# Altium schematic symbol library CUSTOM SCH - Copy.SchLib: 494 symbols (part 5 of 6) (continued)
## UF4007
designator D?
Led Zpower Warm White 3000K 2SMD; Manufacturer 1: Seoul Semiconductor; Manufacturer Part Number: N42180-06-S2; Max Current Rating: 800mA; Luminous Flux: 65lm; Test Current: 350mA; Thermal Resistance of Package: 8.5°C/W; Forward Voltage: 3.1V; Viewing Angle: 126°; Supplier 1: Digi-Key; RoHS: Yes; Category: LEDs; Stock 1: 29310; Pricing 1: 1=2.54000, 10=2.28800, 100=2.14400 (USD); Mount: Surface Mount; Case/Package: SMD/SMT; Color: White; Correlated Color Temperature (CCT): 3000K; Package Quantity: 500; Packaging: Tape and Reel; ComponentLink1URL: https://datasheet.ciiva.com/29560/x42180-070-29560315.pdf?src-supplier=Digi-Key; ComponentLink1Description: https://datasheet.ciiva.com/29560/x42180-070-29560315.pdf?src-supplier=Digi-Key; ComponentLink2URL: https://datasheet.ciiva.com/29560/x42180-070-29560316.pdf?src-supplier=Digi-Key; ComponentLink2Description: https://datasheet.ciiva.com/29560/x42180-070-29560316.pdf?src-supplier=Digi-Key; Supplier Part Number 1: N42180-06-S2CT-ND
footprint 1W POWER LED
pins: 1 K, 2 A, 3 TH

## UJ2-MIBH-3-MSMT-TR-67
designator J?
Waterproof USB Connectors USB jack 2.0; Manufacturer Part Number: UJ2-MIBH-3-MSMT-TR-67; CAse/Package: 490-UJ2MIBH3MSMTTR67; Mouser Price/Stock: https://www.mouser.co.uk/ProductDetail/CUI-Devices/UJ2-MIBH-3-MSMT-TR-67?qs=l7cgNqFNU1iQf9Yue11bmg%3D%3D; Arrow Part Number: UJ2-MIBH-3-MSMT-TR-67; Arrow Price/Stock: https://www.arrow.com/en/products/uj2-mibh-3-msmt-tr-67/cui-devices
footprint UJ2MIBH3MSMTTR67
pins: 1, 2, 3, 4, 5, MH1, MH2, MH3, MH4

## USB3300-EZK
designator U?  Supplier Part Number 1: USB3300-EZK-CT-ND
Hi-Speed USB Host, Device or OTG PHY with / ULPI Low Pin Interface; Manufacturer: Microchip; Manufacturer Part Number: USB3300-EZK-TR; Operating Supply Voltage: 3.3V; Data Rate: 480Mbps; Supplier 1: Digi-Key; RoHS: Yes; Category: USB Interface ICs; Stock 1: 4754; Pricing 1: 1=1.24000, 25=1.04000, 100=0.95760 (USD); Mount: Surface Mount; Case/Package: QFN; Number of Pins: 32; Weight: 0.006653oz; Contact Plating: Tin,Matte; Min Operating Temperature: -40°C; Max Operating Temperature: 85°C; Packaging: Tape and Reel; Package Quantity: 4000; Radiation Hardening: No; Lead Free: Lead Free; ComponentLink1URL: https://datasheet.ciiva.com/6635/filehandler-aspxddocname-en562663-6635175.pdf?src-supplier=Digi-Key; ComponentLink1Description: https://datasheet.ciiva.com/6635/filehandler-aspxddocname-en562663-6635175.pdf?src-supplier=Digi-Key
footprint 32-QFN (5x5)
pins: 1 GND (power), 2 GND (power), 3 CPEN (out), 4 VBUS (io), 5 ID (in), 6 VDD3.3 (power), 7 DP (io), 8 DM (io), 9 RESET (in), 10 EXTVBUS (in), 11 NXT (out), 12 DIR (out), 13 STP (in), 14 CLKOUT (out), 15 VDD1.8 (power), 16 VDD3.3 (power), 17 DATA7 (io), 18 DATA6 (io), 19 DATA5 (io), 20 DATA4 (io), 21 DATA3 (io), 22 DATA2 (io), 23 DATA1 (io), 24 DATA0 (io), 25 VDD3.3 (power), 26 VDD1.8 (power), 27 XO, 28 XI, 29 VDDA1.8 (power), 30 VDD3.3 (power), 31 REG_EN, 32 RBIAS, 33 EPAD
text: USB3300

## USB 4pins_0
designator J?
pins: 1, 2, 3, 4, 5, 6
text: V; D-; D+; G

## USB A Female
designator J?
USB-A (USB TYPE-A) USB 2.0 Receptacle Connector 4 Position Through Hole, Right Angle; Manufacturer: TE Connectivity; Manufacturer Part Number: 292303-1; Plating: Bright,Tin; Number of Positions: 4; Number of Ports: 1; Plating Thickness: 0.76um; Contact Current Rating: 1A; Circuit Application: Signal; Connector System: Cable-to-Board; USB Standard: USB 2.0; Insulation Resistance: 1GR; Voltage Rating (AC): 30V; Pitch: 2.5mm; PCB Thickness: 0.062inch; Tail Length: 0.112inch; Supplier 1: Digi-Key; Supplier Part Number 1: A31726-ND; RoHS: Yes; Category: Audio / Video Connectors; Stock 1: 16288; Pricing 1: 1=1.49000, 10=1.35400, 25=1.27160, 50=1.21620, 100=1.16100, 250=1.05040, 500=0.96748, 1000=0.82926, 2500=0.77398 (USD); Mount: Through Hole,Horizontal; Contact Plating: Gold; Housing Material: Thermoplastic; Housing Color: Black; Contact Material: Copper Alloy,Copper; Number of Terminals: 4; Color: Black; Min Operating Temperature: -67°C; Max Operating Temperature: 185°C; Termination: Through Hole; Package Quantity: 30; Orientation: Right Angle; Packaging: Rail/Tube; Gender: Receptacle; Connector Type: Receptacle; Number of Contacts: 4; Current Rating: 1A; Length: 14.63mm; Depth: 14mm; Flammability Rating: UL94 V-0; REACH SVHC: No SVHC; Halogen Free: Halogen Free; Case/Package: TH; ComponentLink1URL: https://datasheet.ciiva.com/851/eng-cd-292303-e9-851601.pdf?src-supplier=Farnell; ComponentLink1Description: https://datasheet.ciiva.com/851/eng-cd-292303-e9-851601.pdf?src-supplier=Farnell; ComponentLink2URL: https://datasheet.ciiva.com/1099/1653030-1099765.pdf?src-supplier=Newark; ComponentLink2Description: https://datasheet.ciiva.com/1099/1653030-1099765.pdf?src-supplier=Newark; ComponentLink3URL: https://datasheet.ciiva.com/1098/eng-cd-292303-e9-1098298.pdf?src-supplier=Element14; ComponentLink3Description: https://datasheet.ciiva.com/1098/eng-cd-292303-e9-1098298.pdf?src-supplier=Element14; ComponentLink4URL: https://datasheet.ciiva.com/11731/0900766b806d08c4-11731322.pdf?src-supplier=RSComponents; ComponentLink4Description: https://datasheet.ciiva.com/11731/0900766b806d08c4-11731322.pdf?src-supplier=RSComponents; ComponentLink5URL: https://datasheet.ciiva.com/14103/04270708-14103420.pdf?src-supplier=Distrelec; ComponentLink5Description: https://datasheet.ciiva.com/14103/04270708-14103420.pdf?src-supplier=Distrelec; ComponentLink6URL: https://datasheet.ciiva.com/19454/921651-19454494.pdf?src-supplier=Jameco; ComponentLink6Description: https://datasheet.ciiva.com/19454/921651-19454494.pdf?src-supplier=Jameco; ComponentLink7URL: https://datasheet.ciiva.com/16308/eng-cd-292303-e7-16308319.pdf?src-supplier=Future+Electronics; ComponentLink7Description: https://datasheet.ciiva.com/16308/eng-cd-292303-e7-16308319.pdf?src-supplier=Future+Electronics; ComponentLink8URL: https://datasheet.ciiva.com/3094/eng-ds-1-1773453-6-0908-3094357.pdf?src-supplier=Avnet; ComponentLink8Description: https://datasheet.ciiva.com/3094/eng-ds-1-1773453-6-0908-3094357.pdf?src-supplier=Avnet; ComponentLink9URL: https://datasheet.ciiva.com/16468/eng-ds-1-1773453-6-0908-16468232.pdf?src-supplier=Avnet+Asia; ComponentLink9Description: https://datasheet.ciiva.com/16468/eng-ds-1-1773453-6-0908-16468232.pdf?src-supplier=Avnet+Asia; ComponentLink10URL: https://datasheet.ciiva.com/851/eng-cd-292303-e9-851082.pdf?src-supplier=Digi-Key; ComponentLink10Description: https://datasheet.ciiva.com/851/eng-cd-292303-e9-851082.pdf?src-supplier=Digi-Key; ComponentLink11URL: https://datasheet.ciiva.com/8016/1653030-8016986.pdf?src-supplier=Element14; ComponentLink11Description: https://datasheet.ciiva.com/8016/1653030-8016986.pdf?src-supplier=Element14; ComponentLink12URL: https://datasheet.ciiva.com/14618/70041246-14618698.pdf?src-supplier=Allied+Electronics; ComponentLink12Description: https://datasheet.ciiva.com/14618/70041246-14618698.pdf?src-supplier=Allied+Electronics; ComponentLink13URL: https://datasheet.ciiva.com/25907/eng-ds-1-1773453-6-0908-25907515.pdf?src-supplier=Avnet+Europe; ComponentLink13Description: https://datasheet.ciiva.com/25907/eng-ds-1-1773453-6-0908-25907515.pdf?src-supplier=Avnet+Europe; ComponentLink14URL: https://datasheet.ciiva.com/30148/ddecontrolleractionsrchrtrvdocnm117734536doctypedsdoclan-30148862.pdf?src-supplier=Onlinecomponents.com; ComponentLink14Description: https://datasheet.ciiva.com/30148/ddecontrolleractionsrchrtrvdocnm117734536doctypedsdoclan-30148862.pdf?src-supplier=Onlinecomponents.com
footprint USB A FEMALE
pins: 1 Vcc (io), 2 D- (io), 3 D+ (io), 4 GND (io), SHELL SHIELD (io), SHELL SHIELD (io)

## USB MALE
designator J?  (value not drawn)
SOFNG : USB - Type A Male USB 2 4 Through Hole USB Connectors RoHS; Manufacturer Part Number: USB-05; Case/Package: TH
footprint Molex_48037-0001_0
pins: 1 VBUS, 2 D-, 3 D+, 4 GND, 5 MNT 1, 6 MNT 2

## USB MICRO B
designator J?
USB MICRO TYPE B SMD; Manufacturer Part Number: 10118192-0001LF; Case/Package: SMD
footprint 101181920001LF
footprint USB TYPE B SMD (SMD)
pins: 1 VBUS, 2 D-, 3 D+, 4 ID, 5 GND, 6, 7, 8, 9, 10, 11

## USB Sunrom 4653
designator J?
Sunrom Product Code for Ordering:4653; Manufacturer Part Number: 4653; MF: Global Connector Technology; SnapEDA_Link: https://www.snapeda.com/parts/USB3075-30-A/Global%20Connector%20Technology/view-part/?ref=snap; Package: None; Availability: Unavailable; Price: None; Value: *
footprint USB_SUNROM_4653
pins: 1 VBUS (power), 2 D-, 3 D+, 4 ID, 5 GND (power), 6 SHIELD, 7 SHIELD, 8 SHIELD, 9 SHIELD, 10 SHIELD, 11 SHIELD

## USB TYPE B
designator P?  Manufacturer Part Number: AU-Y1007-R
CONN RCPT USB1.1 TYPEB 4POS R/A; Manufacturer: Assmann; Max Current Rating: 1A; Connector Type: USB; Number of Contacts: 4; Gender: Receptacle; Number of Ports: 1; Pitch: 2.5mm; Supplier 1: Digi-Key; Stock 1: 0; Mount: Through Hole,Horizontal; Contact Material: Brass; Contact Plating: Gold; Number of Terminals: 4; Housing Material: Polybutylene; Min Operating Temperature: -55°C; Max Operating Temperature: 105°C; Package Quantity: 100; Packaging: Bulk; Number of Positions: 4; Termination: Solder; Orientation: Right Angle; Length: 16mm; Height: 10.6mm; Width: 12mm; Lead Free: Lead Free; ComponentLink1URL: http://www.onlinecomponents.com/productFiles/mf-ASS/au-y1007-r.pdf?src-supplier=Onlinecomponents.com; ComponentLink1Description: http://www.onlinecomponents.com/productFiles/mf-ASS/au-y1007-r.pdf?src-supplier=Onlinecomponents.com; ComponentLink2URL: https://media.digikey.com/pdf/Data%20Sheets/Assmann%20PDFs/AU-Y1007-R_Dwg.pdf?src-supplier=Digi-Key; ComponentLink2Description: https://media.digikey.com/pdf/Data%20Sheets/Assmann%20PDFs/AU-Y1007-R_Dwg.pdf?src-supplier=Digi-Key; Supplier Part Number 1: AE9925-ND
footprint CON4_1X4_USB_B_A
pins: 1, 2, 3, 4, 5, 6

## USB TYPE C
designator J?
USB Connectors 24 Receptacle 1 8.94*7.3mm RoHS; Manufacturer Part Number: TYPE-C-31-M-12; Case/Package: SMD/SMT
footprint USB TYPE C (12 Pins)
pins: A1B12 GND (power), A4B9 VBUS (power), A5 CC1 (io), A6 DP1 (io), A7 DN1 (io), A8 SBU1 (io), B1A12 GND (power), B4A9 VBUS (power), B5 CC2 (io), B6 DP2 (io), B7 DN2 (io), B8 SBU2 (io), S1 SHIELD, S2 SHIELD, S3 SHIELD, S4 SHIELD

## USB type C Verticle
designator J?
Connector; Manufacturer Part Number: 217182-0001; Case/Package: SMD
footprint USB TYPE C Verticle
pins: A1, A4, A5, A6, A7, A8, A9, A12, B1, B4, B5, B6, B7, B8, B9, B12, MH2, MH3, MH5, MH6

## USB Type-A 3.0
designator J?, comment Female  (value not drawn)
USB-A _USB TYPE-A_ USB 3.0 _USB 3.1 Gen 1, Superspeed_ Receptacle Connector 9 Position Through Hole, Right Angle; Manufacturer Part Number: 10117835-002LF; Value: *; Case/Package: Through Hole
footprint FCI_10117835-002LF
footprint USB Type-A 3.0
pins: 1 VBUS (power), 2 D- (io), 3 D+ (io), 4 GND (power), 5 STDA_SSRX- (io), 6 STDA_SSRX+ (io), 7 GND_DRAIN (power), 8 STDA_SSTX- (io), 9 STDA_SSTX+ (io)

## USB Type-A 3.0 SMD
designator J?, comment USB Type-A 3.0
Manufacturer_Part_Number: 692122030100; CAse/Package: SMD
footprint USB Type-A 3.0 SMD
pins: 1 VBUS, 2 D-, 3 D+, 4 GND, 5 STDA_SSRX-, 6 STDA_SSRX+, 7 GND_DRAIN, 8 STDA_SSTX-, 9 STDA_SSTX+, MH1, MH2

## USB TYPE-C 24P
designator J?  Manufacturer Part Number: 2012670005  Case/Package: SMD Right Angle
USB Type-c
footprint TYPEC30_24P_SD-2012670005
footprint TYPEC_KLS1-5407
pins: A1 GND1, A2 SSTX1_P, A3 SSTX1_N, A4 VBUS_1, A5 CC1, A6 DP1, A7 DM1, A8 SBU1, A9 VBUS_2, A10 SSRX2_N, A11 SSRX2_P, A12 GND2, B1 GND3, B2 SSTX2_P, B3 SSTX2_N, B4 VBUS_3, B5 CC2, B6 DP2, B7 DM2, B8 SBU2, B9 VBUS_4, B10 SSRX1_N, B11 SSRX1_P, B12 GND4, H1 HOLE_1, H2 HOLE_2, H3 HOLE_3, H4 HOLE_4

## USB TYPE-C 24P_vertical
designator J?  Manufacturer Part Number: 2047110001  Case/Package: SMD vertical Angle
USB Type-c vertical 24 pins
footprint TYPEC30_24P_SD-2012670005
footprint TYPEC_KLS1-5407
footprint Type-C Connector 24pin vertical
pins: 1 SHIELD, 2 SHIELD, 3 SHIELD, 4 SHIELD, 5 SHIELD, 6 SHIELD, A1 GND1, A2 SSTX1_P, A3 SSTX1_N, A4 VBUS_1, A5 CC1, A6 DP1, A7 DM1, A8 SBU1, A9 VBUS_2, A10 SSRX2_N, A11 SSRX2_P, A12 GND2, B1 GND3, B2 SSTX2_P, B3 SSTX2_N, B4 VBUS_3, B5 CC2, B6 DP2, B7 DM2, B8 SBU2, B9 VBUS_4, B10 SSRX1_N, B11 SSRX1_P, B12 GND4

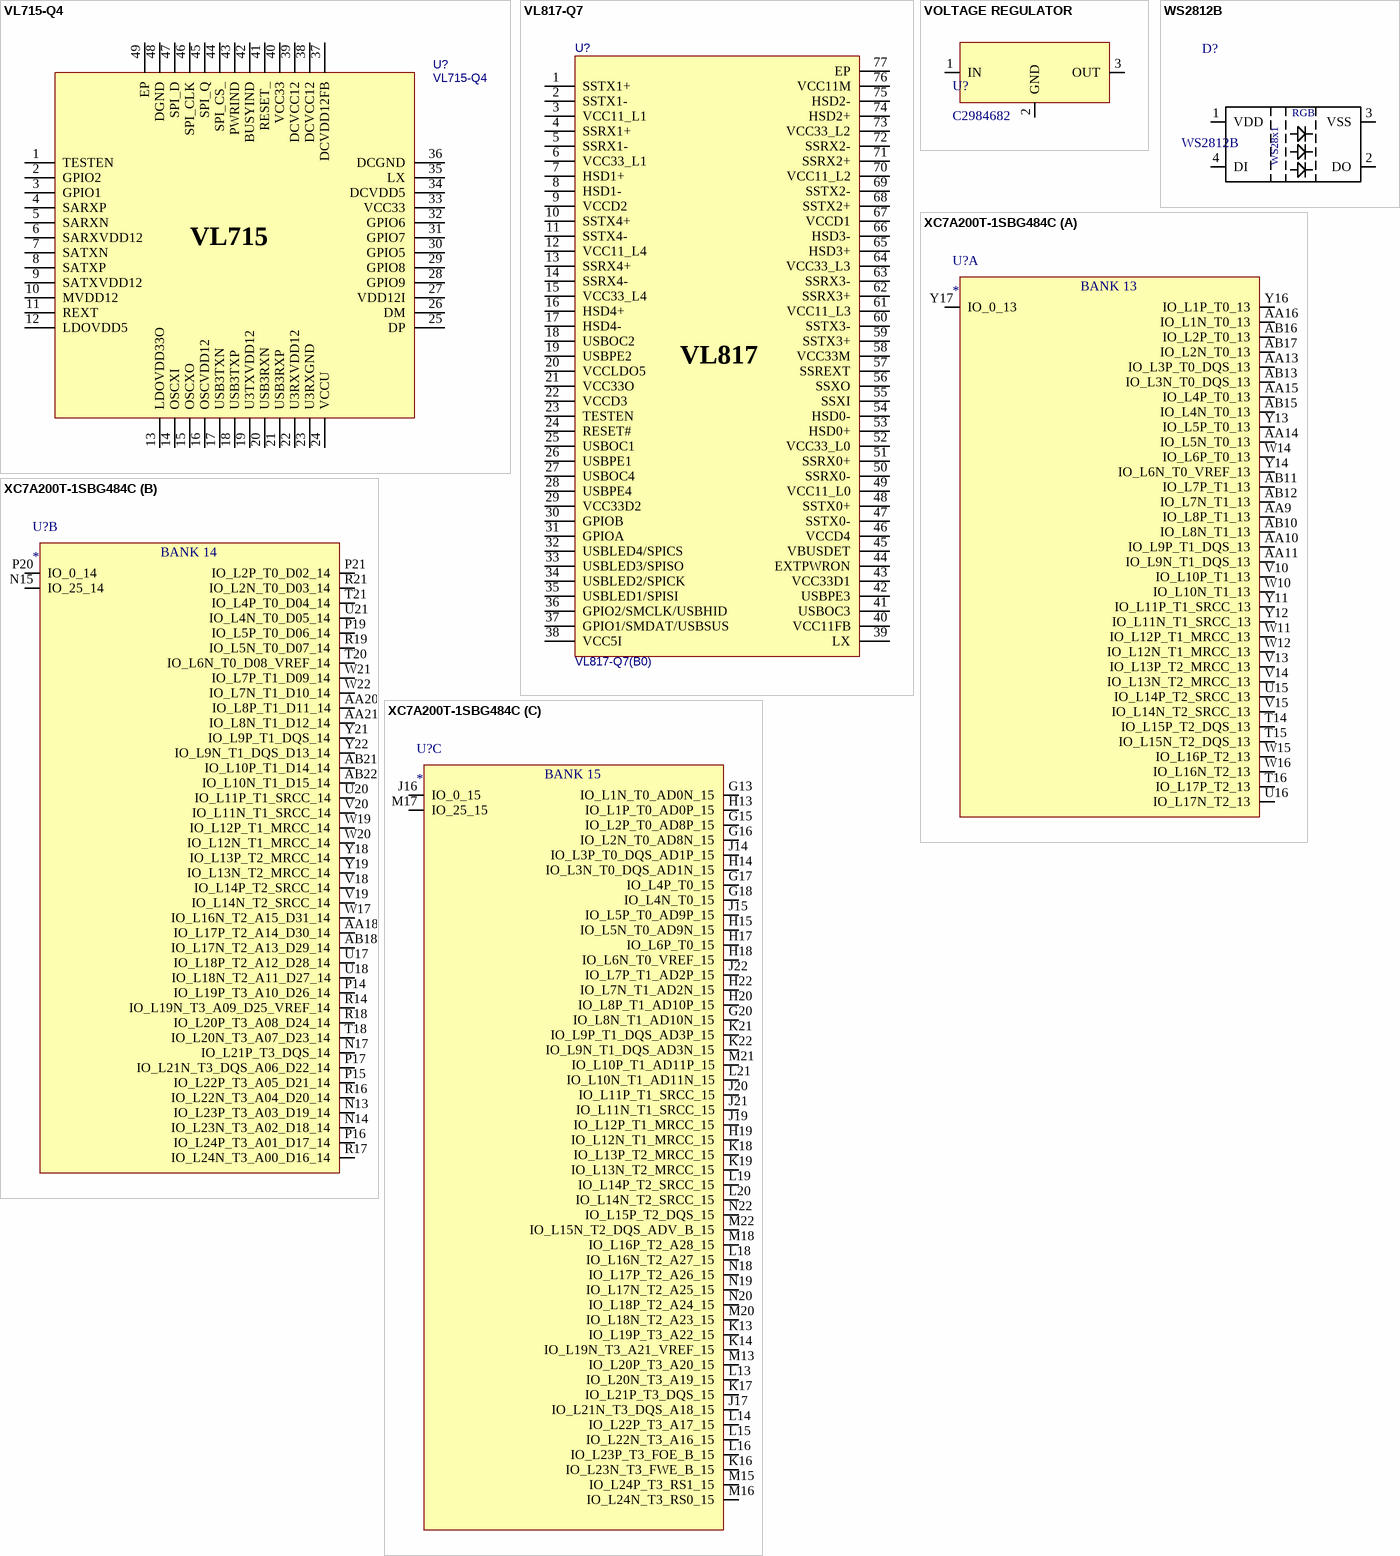
[diagram p44: symbols VL715-Q4 to XC7A200T-1SBG484C]

## VL715-Q4
designator U?
Case/Package: QFN-48; Manufacturer Part Number: VL715-Q4
footprint VL711-Q4
pins: 1 TESTEN, 2 GPIO2, 3 GPIO1, 4 SARXP, 5 SARXN, 6 SARXVDD12, 7 SATXN, 8 SATXP, 9 SATXVDD12, 10 MVDD12, 11 REXT, 12 LDOVDD5, 13 LDOVDD33O, 14 OSCXI, 15 OSCXO, 16 OSCVDD12, 17 USB3TXN, 18 USB3TXP, 19 U3TXVDD12, 20 USB3RXN, 21 USB3RXP, 22 U3RXVDD12, 23 U3RXGND, 24 VCCU, 25 DP, 26 DM, 27 VDD12I, 28 GPIO9, 29 GPIO8, 30 GPIO5, 31 GPIO7, 32 GPIO6, 33 VCC33, 34 DCVDD5, 35 LX, 36 DCGND, 37 DCVDD12FB, 38 DCVCC12, 39 DCVCC12, 40 VCC33, 41 RESET_, 42 BUSYIND, 43 PWRIND, 44 SPI_CS_, 45 SPI_Q, 46 SPI_CLK, 47 SPI_D, 48 DGND, 49 EP
text: VL715

## VL817-Q7
designator U?, comment VL817-Q7(B0)
Case/Package: QFN-76; Manufacturer Part Number: VL817-Q7
footprint QFN-76_L9.0-W9.0-P0.40-BL-EP
footprint VL817-Q7
pins: 1 SSTX1+, 2 SSTX1-, 3 VCC11_L1, 4 SSRX1+, 5 SSRX1-, 6 VCC33_L1, 7 HSD1+, 8 HSD1-, 9 VCCD2, 10 SSTX4+, 11 SSTX4-, 12 VCC11_L4, 13 SSRX4+, 14 SSRX4-, 15 VCC33_L4, 16 HSD4+, 17 HSD4-, 18 USBOC2, 19 USBPE2, 20 VCCLDO5, 21 VCC33O, 22 VCCD3, 23 TESTEN, 24 RESET#, 25 USBOC1, 26 USBPE1, 27 USBOC4, 28 USBPE4, 29 VCC33D2, 30 GPIOB, 31 GPIOA, 32 USBLED4/SPICS, 33 USBLED3/SPISO, 34 USBLED2/SPICK, 35 USBLED1/SPISI, 36 GPIO2/SMCLK/USBHID, 37 GPIO1/SMDAT/USBSUS, 38 VCC5I, 39 LX, 40 VCC11FB, 41 USBOC3, 42 USBPE3, 43 VCC33D1, 44 EXTPWRON, 45 VBUSDET, 46 VCCD4, 47 SSTX0-, 48 SSTX0+, 49 VCC11_L0, 50 SSRX0-, 51 SSRX0+, 52 VCC33_L0, 53 HSD0+, 54 HSD0-, 55 SSXI, 56 SSXO, 57 SSREXT, 58 VCC33M, 59 SSTX3+, 60 SSTX3-, 61 VCC11_L3, 62 SSRX3+, 63 SSRX3-, 64 VCC33_L3, 65 HSD3+, 66 HSD3-, 67 VCCD1, 68 SSTX2+, 69 SSTX2-, 70 VCC11_L2, 71 SSRX2+, 72 SSRX2-, 73 VCC33_L2, 74 HSD2+, 75 HSD2-, 76 VCC11M, 77 EP
text: VL817

## VOLTAGE REGULATOR
designator U?, comment C2984682
TO-252 Linear Voltage Regulators (LDO) ROHS; Manufacturer Part Number: 78M05; Case/Package: TO-252
footprint TO-252 VOLTAGE REGULATOR
pins: 1 IN, 2 GND, 3 OUT

## WS2812B
designator D?
Intelligent Control Led Integrated Light Source Pack Of 10; MF: Worldsemi; Availability: Unavailable; SnapEDA_Link: https://www.snapeda.com/parts/WS2812B/Adafruit%20Industries/view-part/?ref=snap; Price: None; Package: None; MP: WS2812B; Value: *
footprint WS2812B
pins: 1 VDD, 2 DO, 3 VSS, 4 DI
text: RGB; WS28x1

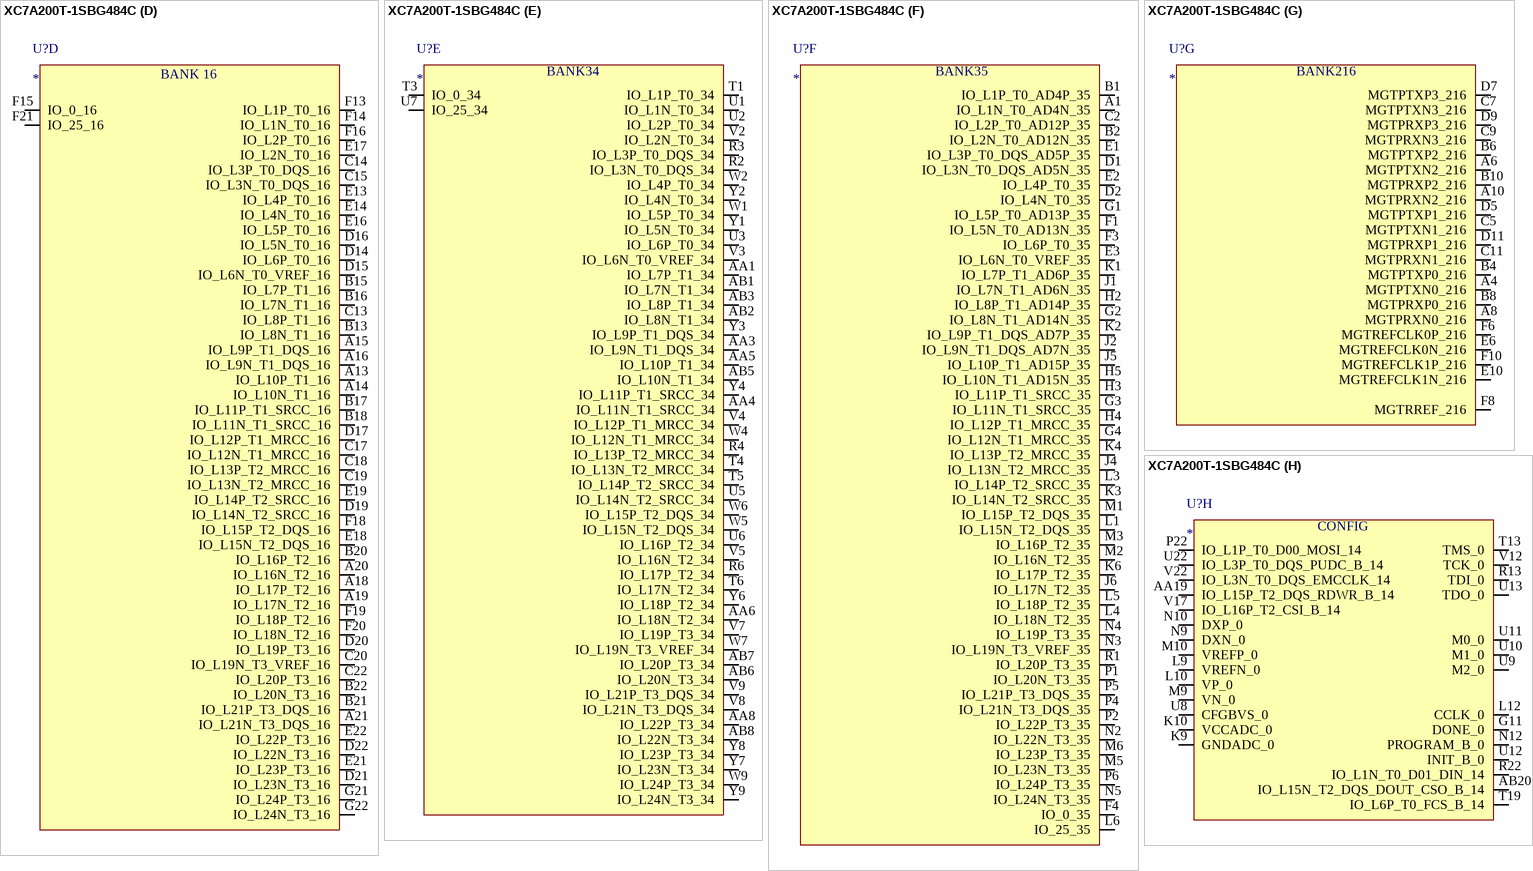
[diagram p45: symbol XC7A200T-1SBG484C]

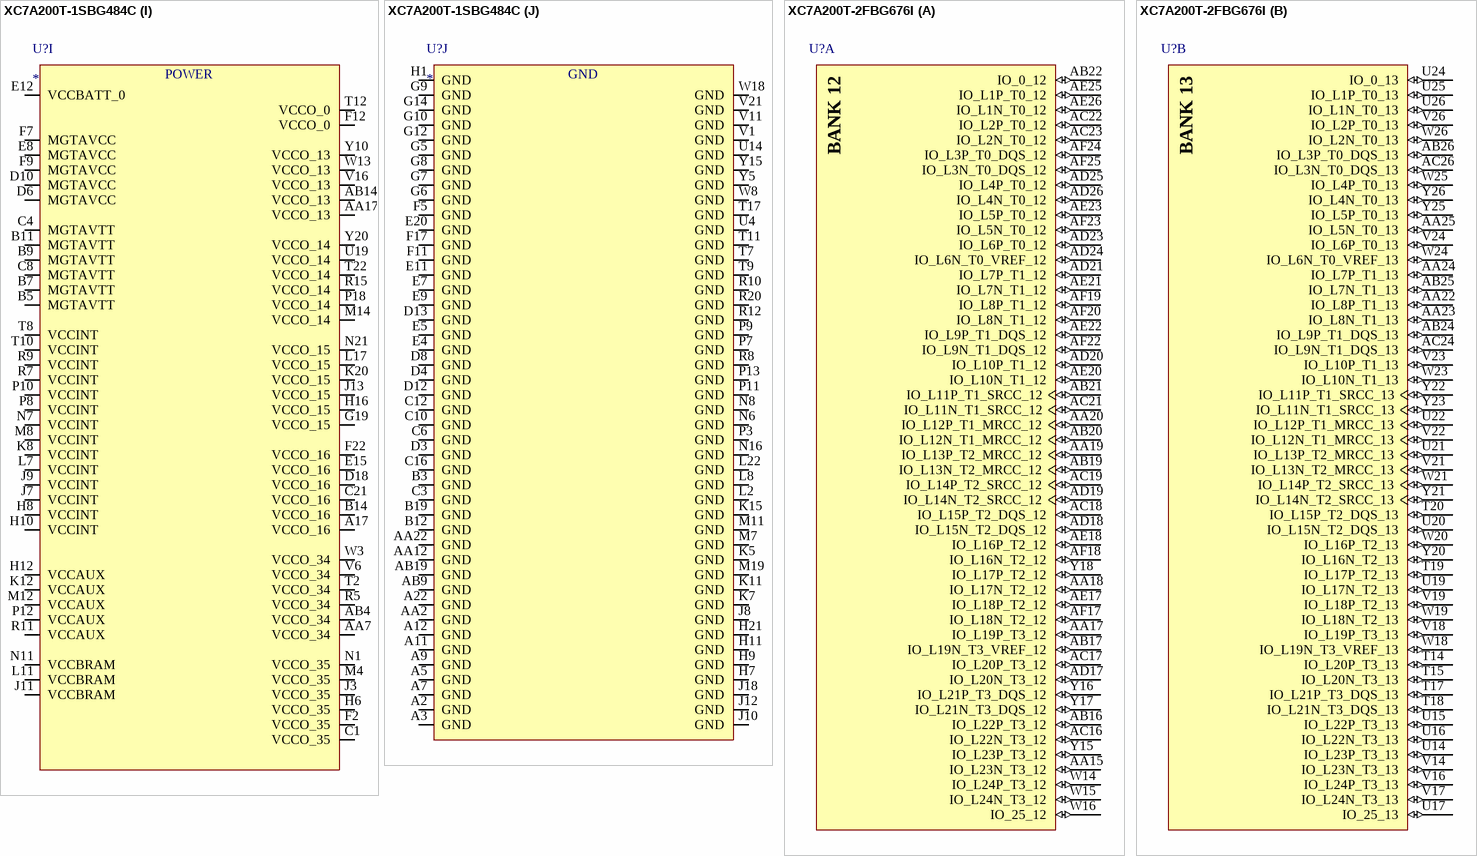
[diagram p46: symbols XC7A200T-1SBG484C to XC7A200T-2FBG676I]

## XC7A200T-1SBG484C
designator U?
Parameter 1: *; Parameter 2: *
part A pins: AA9 IO_L8P_T1_13, AA10 IO_L9P_T1_DQS_13, AA11 IO_L9N_T1_DQS_13, AA13 IO_L3P_T0_DQS_13, AA14 IO_L5N_T0_13, AA15 IO_L4P_T0_13, AA16 IO_L1N_T0_13, AB10 IO_L8N_T1_13, AB11 IO_L7P_T1_13, AB12 IO_L7N_T1_13, AB13 IO_L3N_T0_DQS_13, AB15 IO_L4N_T0_13, AB16 IO_L2P_T0_13, AB17 IO_L2N_T0_13, T14 IO_L15P_T2_DQS_13, T15 IO_L15N_T2_DQS_13, T16 IO_L17P_T2_13, U15 IO_L14P_T2_SRCC_13, U16 IO_L17N_T2_13, V10 IO_L10P_T1_13, V13 IO_L13P_T2_MRCC_13, V14 IO_L13N_T2_MRCC_13, V15 IO_L14N_T2_SRCC_13, W10 IO_L10N_T1_13, W11 IO_L12P_T1_MRCC_13, W12 IO_L12N_T1_MRCC_13, W14 IO_L6P_T0_13, W15 IO_L16P_T2_13, W16 IO_L16N_T2_13, Y11 IO_L11P_T1_SRCC_13, Y12 IO_L11N_T1_SRCC_13, Y13 IO_L5P_T0_13, Y14 IO_L6N_T0_VREF_13, Y16 IO_L1P_T0_13, Y17 IO_0_13
part B pins: AA18 IO_L17P_T2_A14_D30_14, AA20 IO_L8P_T1_D11_14, AA21 IO_L8N_T1_D12_14, AB18 IO_L17N_T2_A13_D29_14, AB21 IO_L10P_T1_D14_14, AB22 IO_L10N_T1_D15_14, N13 IO_L23P_T3_A03_D19_14, N14 IO_L23N_T3_A02_D18_14, N15 IO_25_14, N17 IO_L21P_T3_DQS_14, P14 IO_L19P_T3_A10_D26_14, P15 IO_L22P_T3_A05_D21_14, P16 IO_L24P_T3_A01_D17_14, P17 IO_L21N_T3_DQS_A06_D22_14, P19 IO_L5P_T0_D06_14, P20 IO_0_14, P21 IO_L2P_T0_D02_14, R14 IO_L19N_T3_A09_D25_VREF_14, R16 IO_L22N_T3_A04_D20_14, R17 IO_L24N_T3_A00_D16_14, R18 IO_L20P_T3_A08_D24_14, R19 IO_L5N_T0_D07_14, R21 IO_L2N_T0_D03_14, T18 IO_L20N_T3_A07_D23_14, T20 IO_L6N_T0_D08_VREF_14, T21 IO_L4P_T0_D04_14, U17 IO_L18P_T2_A12_D28_14, U18 IO_L18N_T2_A11_D27_14, U20 IO_L11P_T1_SRCC_14, U21 IO_L4N_T0_D05_14, V18 IO_L14P_T2_SRCC_14, V19 IO_L14N_T2_SRCC_14, V20 IO_L11N_T1_SRCC_14, W17 IO_L16N_T2_A15_D31_14, W19 IO_L12P_T1_MRCC_14, W20 IO_L12N_T1_MRCC_14, W21 IO_L7P_T1_D09_14, W22 IO_L7N_T1_D10_14, Y18 IO_L13P_T2_MRCC_14, Y19 IO_L13N_T2_MRCC_14, Y21 IO_L9P_T1_DQS_14, Y22 IO_L9N_T1_DQS_D13_14
part C pins: G13 IO_L1N_T0_AD0N_15, G15 IO_L2P_T0_AD8P_15, G16 IO_L2N_T0_AD8N_15, G17 IO_L4P_T0_15, G18 IO_L4N_T0_15, G20 IO_L8N_T1_AD10N_15, H13 IO_L1P_T0_AD0P_15, H14 IO_L3N_T0_DQS_AD1N_15, H15 IO_L5N_T0_AD9N_15, H17 IO_L6P_T0_15, H18 IO_L6N_T0_VREF_15, H19 IO_L12N_T1_MRCC_15, H20 IO_L8P_T1_AD10P_15, H22 IO_L7N_T1_AD2N_15, J14 IO_L3P_T0_DQS_AD1P_15, J15 IO_L5P_T0_AD9P_15, J16 IO_0_15, J17 IO_L21N_T3_DQS_A18_15, J19 IO_L12P_T1_MRCC_15, J20 IO_L11P_T1_SRCC_15, J21 IO_L11N_T1_SRCC_15, J22 IO_L7P_T1_AD2P_15, K13 IO_L19P_T3_A22_15, K14 IO_L19N_T3_A21_VREF_15, K16 IO_L23N_T3_FWE_B_15, K17 IO_L21P_T3_DQS_15, K18 IO_L13P_T2_MRCC_15, K19 IO_L13N_T2_MRCC_15, K21 IO_L9P_T1_DQS_AD3P_15, K22 IO_L9N_T1_DQS_AD3N_15, L13 IO_L20N_T3_A19_15, L14 IO_L22P_T3_A17_15, L15 IO_L22N_T3_A16_15, L16 IO_L23P_T3_FOE_B_15, L18 IO_L16N_T2_A27_15, L19 IO_L14P_T2_SRCC_15, L20 IO_L14N_T2_SRCC_15, L21 IO_L10N_T1_AD11N_15, M13 IO_L20P_T3_A20_15, M15 IO_L24P_T3_RS1_15, M16 IO_L24N_T3_RS0_15, M17 IO_25_15, M18 IO_L16P_T2_A28_15, M20 IO_L18N_T2_A23_15, M21 IO_L10P_T1_AD11P_15, M22 IO_L15N_T2_DQS_ADV_B_15, N18 IO_L17P_T2_A26_15, N19 IO_L17N_T2_A25_15, N20 IO_L18P_T2_A24_15, N22 IO_L15P_T2_DQS_15
part D pins: A13 IO_L10P_T1_16, A14 IO_L10N_T1_16, A15 IO_L9P_T1_DQS_16, A16 IO_L9N_T1_DQS_16, A18 IO_L17P_T2_16, A19 IO_L17N_T2_16, A20 IO_L16N_T2_16, A21 IO_L21N_T3_DQS_16, B13 IO_L8N_T1_16, B15 IO_L7P_T1_16, B16 IO_L7N_T1_16, B17 IO_L11P_T1_SRCC_16, B18 IO_L11N_T1_SRCC_16, B20 IO_L16P_T2_16, B21 IO_L21P_T3_DQS_16, B22 IO_L20N_T3_16, C13 IO_L8P_T1_16, C14 IO_L3P_T0_DQS_16, C15 IO_L3N_T0_DQS_16, C17 IO_L12N_T1_MRCC_16, C18 IO_L13P_T2_MRCC_16, C19 IO_L13N_T2_MRCC_16, C20 IO_L19N_T3_VREF_16, C22 IO_L20P_T3_16, D14 IO_L6P_T0_16, D15 IO_L6N_T0_VREF_16, D16 IO_L5N_T0_16, D17 IO_L12P_T1_MRCC_16, D19 IO_L14N_T2_SRCC_16, D20 IO_L19P_T3_16, D21 IO_L23N_T3_16, D22 IO_L22N_T3_16, E13 IO_L4P_T0_16, E14 IO_L4N_T0_16, E16 IO_L5P_T0_16, E17 IO_L2N_T0_16, E18 IO_L15N_T2_DQS_16, E19 IO_L14P_T2_SRCC_16, E21 IO_L23P_T3_16, E22 IO_L22P_T3_16, F13 IO_L1P_T0_16, F14 IO_L1N_T0_16, F15 IO_0_16, F16 IO_L2P_T0_16, F18 IO_L15P_T2_DQS_16, F19 IO_L18P_T2_16, F20 IO_L18N_T2_16, F21 IO_25_16, G21 IO_L24P_T3_16, G22 IO_L24N_T3_16
part E pins: AA1 IO_L7P_T1_34, AA3 IO_L9N_T1_DQS_34, AA4 IO_L11N_T1_SRCC_34, AA5 IO_L10P_T1_34, AA6 IO_L18N_T2_34, AA8 IO_L22P_T3_34, AB1 IO_L7N_T1_34, AB2 IO_L8N_T1_34, AB3 IO_L8P_T1_34, AB5 IO_L10N_T1_34, AB6 IO_L20N_T3_34, AB7 IO_L20P_T3_34, AB8 IO_L22N_T3_34, R2 IO_L3N_T0_DQS_34, R3 IO_L3P_T0_DQS_34, R4 IO_L13P_T2_MRCC_34, R6 IO_L17P_T2_34, T1 IO_L1P_T0_34, T3 IO_0_34, T4 IO_L13N_T2_MRCC_34, T5 IO_L14P_T2_SRCC_34, T6 IO_L17N_T2_34, U1 IO_L1N_T0_34, U2 IO_L2P_T0_34, U3 IO_L6P_T0_34, U5 IO_L14N_T2_SRCC_34, U6 IO_L16P_T2_34, U7 IO_25_34, V2 IO_L2N_T0_34, V3 IO_L6N_T0_VREF_34, V4 IO_L12P_T1_MRCC_34, V5 IO_L16N_T2_34, V7 IO_L19P_T3_34, V8 IO_L21N_T3_DQS_34, V9 IO_L21P_T3_DQS_34, W1 IO_L5P_T0_34, W2 IO_L4P_T0_34, W4 IO_L12N_T1_MRCC_34, W5 IO_L15N_T2_DQS_34, W6 IO_L15P_T2_DQS_34, W7 IO_L19N_T3_VREF_34, W9 IO_L24P_T3_34, Y1 IO_L5N_T0_34, Y2 IO_L4N_T0_34, Y3 IO_L9P_T1_DQS_34, Y4 IO_L11P_T1_SRCC_34, Y6 IO_L18P_T2_34, Y7 IO_L23N_T3_34, Y8 IO_L23P_T3_34, Y9 IO_L24N_T3_34
part F pins: A1 IO_L1N_T0_AD4N_35, B1 IO_L1P_T0_AD4P_35, B2 IO_L2N_T0_AD12N_35, C2 IO_L2P_T0_AD12P_35, D1 IO_L3N_T0_DQS_AD5N_35, D2 IO_L4N_T0_35, E1 IO_L3P_T0_DQS_AD5P_35, E2 IO_L4P_T0_35, E3 IO_L6N_T0_VREF_35, F1 IO_L5N_T0_AD13N_35, F3 IO_L6P_T0_35, F4 IO_0_35, G1 IO_L5P_T0_AD13P_35, G2 IO_L8N_T1_AD14N_35, G3 IO_L11N_T1_SRCC_35, G4 IO_L12N_T1_MRCC_35, H2 IO_L8P_T1_AD14P_35, H3 IO_L11P_T1_SRCC_35, H4 IO_L12P_T1_MRCC_35, H5 IO_L10N_T1_AD15N_35, J1 IO_L7N_T1_AD6N_35, J2 IO_L9N_T1_DQS_AD7N_35, J4 IO_L13N_T2_MRCC_35, J5 IO_L10P_T1_AD15P_35, J6 IO_L17N_T2_35, K1 IO_L7P_T1_AD6P_35, K2 IO_L9P_T1_DQS_AD7P_35, K3 IO_L14N_T2_SRCC_35, K4 IO_L13P_T2_MRCC_35, K6 IO_L17P_T2_35, L1 IO_L15N_T2_DQS_35, L3 IO_L14P_T2_SRCC_35, L4 IO_L18N_T2_35, L5 IO_L18P_T2_35, L6 IO_25_35, M1 IO_L15P_T2_DQS_35, M2 IO_L16N_T2_35, M3 IO_L16P_T2_35, M5 IO_L23N_T3_35, M6 IO_L23P_T3_35, N2 IO_L22N_T3_35, N3 IO_L19N_T3_VREF_35, N4 IO_L19P_T3_35, N5 IO_L24N_T3_35, P1 IO_L20N_T3_35, P2 IO_L22P_T3_35, P4 IO_L21N_T3_DQS_35, P5 IO_L21P_T3_DQS_35, P6 IO_L24P_T3_35, R1 IO_L20P_T3_35
part G pins: A4 MGTPTXN0_216, A6 MGTPTXN2_216, A8 MGTPRXN0_216, A10 MGTPRXN2_216, B4 MGTPTXP0_216, B6 MGTPTXP2_216, B8 MGTPRXP0_216, B10 MGTPRXP2_216, C5 MGTPTXN1_216, C7 MGTPTXN3_216, C9 MGTPRXN3_216, C11 MGTPRXN1_216, D5 MGTPTXP1_216, D7 MGTPTXP3_216, D9 MGTPRXP3_216, D11 MGTPRXP1_216, E6 MGTREFCLK0N_216, E10 MGTREFCLK1N_216, F6 MGTREFCLK0P_216, F8 MGTRREF_216, F10 MGTREFCLK1P_216
part H pins: AA19 IO_L15P_T2_DQS_RDWR_B_14, AB20 IO_L15N_T2_DQS_DOUT_CSO_B_14, G11 DONE_0, K9 GNDADC_0, K10 VCCADC_0, L9 VREFN_0, L10 VP_0, L12 CCLK_0, M9 VN_0, M10 VREFP_0, N9 DXN_0, N10 DXP_0, N12 PROGRAM_B_0, P22 IO_L1P_T0_D00_MOSI_14, R13 TDI_0, R22 IO_L1N_T0_D01_DIN_14, T13 TMS_0, T19 IO_L6P_T0_FCS_B_14, U8 CFGBVS_0, U9 M2_0, U10 M1_0, U11 M0_0, U12 INIT_B_0, U13 TDO_0, U22 IO_L3P_T0_DQS_PUDC_B_14, V12 TCK_0, V17 IO_L16P_T2_CSI_B_14, V22 IO_L3N_T0_DQS_EMCCLK_14
part I pins: A17 VCCO_16, AA7 VCCO_34, AA17 VCCO_13, AB4 VCCO_34, AB14 VCCO_13, B5 MGTAVTT, B7 MGTAVTT, B9 MGTAVTT, B11 MGTAVTT, B14 VCCO_16, C1 VCCO_35, C4 MGTAVTT, C8 MGTAVTT, C21 VCCO_16, D6 MGTAVCC, D10 MGTAVCC, D18 VCCO_16, E8 MGTAVCC, E12 VCCBATT_0, E15 VCCO_16, F2 VCCO_35, F7 MGTAVCC, F9 MGTAVCC, F12 VCCO_0, F22 VCCO_16, G19 VCCO_15, H6 VCCO_35, H8 VCCINT, H10 VCCINT, H12 VCCAUX, H16 VCCO_15, J3 VCCO_35, J7 VCCINT, J9 VCCINT, J11 VCCBRAM, J13 VCCO_15, K8 VCCINT, K12 VCCAUX, K20 VCCO_15, L7 VCCINT, L11 VCCBRAM, L17 VCCO_15, M4 VCCO_35, M8 VCCINT, M12 VCCAUX, M14 VCCO_14, N1 VCCO_35, N7 VCCINT, N11 VCCBRAM, N21 VCCO_15, P8 VCCINT, P10 VCCINT, P12 VCCAUX, P18 VCCO_14, R5 VCCO_34, R7 VCCINT, R9 VCCINT, R11 VCCAUX, R15 VCCO_14, T2 VCCO_34, T8 VCCINT, T10 VCCINT, T12 VCCO_0, T22 VCCO_14, U19 VCCO_14, V6 VCCO_34, V16 VCCO_13, W3 VCCO_34, W13 VCCO_13, Y10 VCCO_13, Y20 VCCO_14
part J pins: A2 GND, A3 GND, A5 GND, A7 GND, A9 GND, A11 GND, A12 GND, A22 GND, AA2 GND, AA12 GND, AA22 GND, AB9 GND, AB19 GND, B3 GND, B12 GND, B19 GND, C3 GND, C6 GND, C10 GND, C12 GND, C16 GND, D3 GND, D4 GND, D8 GND, D12 GND, D13 GND, E4 GND, E5 GND, E7 GND, E9 GND, E11 GND, E20 GND, F5 GND, F11 GND, F17 GND, G5 GND, G6 GND, G7 GND, G8 GND, G9 GND, G10 GND, G12 GND, G14 GND, H1 GND, H7 GND, H9 GND, H11 GND, H21 GND, J8 GND, J10 GND, J12 GND, J18 GND, K5 GND, K7 GND, K11 GND, K15 GND, L2 GND, L8 GND, L22 GND, M7 GND, M11 GND, M19 GND, N6 GND, N8 GND, N16 GND, P3 GND, P7 GND, P9 GND, P11 GND, P13 GND, R8 GND, R10 GND, R12 GND, R20 GND, T7 GND, T9 GND, T11 GND, T17 GND, U4 GND, U14 GND, V1 GND, V11 GND, V21 GND, W8 GND, W18 GND, Y5 GND, Y15 GND
part A text: BANK 13
part B text: BANK 14
part C text: BANK 15
part D text: BANK 16
part E text: BANK34
part F text: BANK35
part G text: BANK216
part H text: CONFIG
part I text: POWER

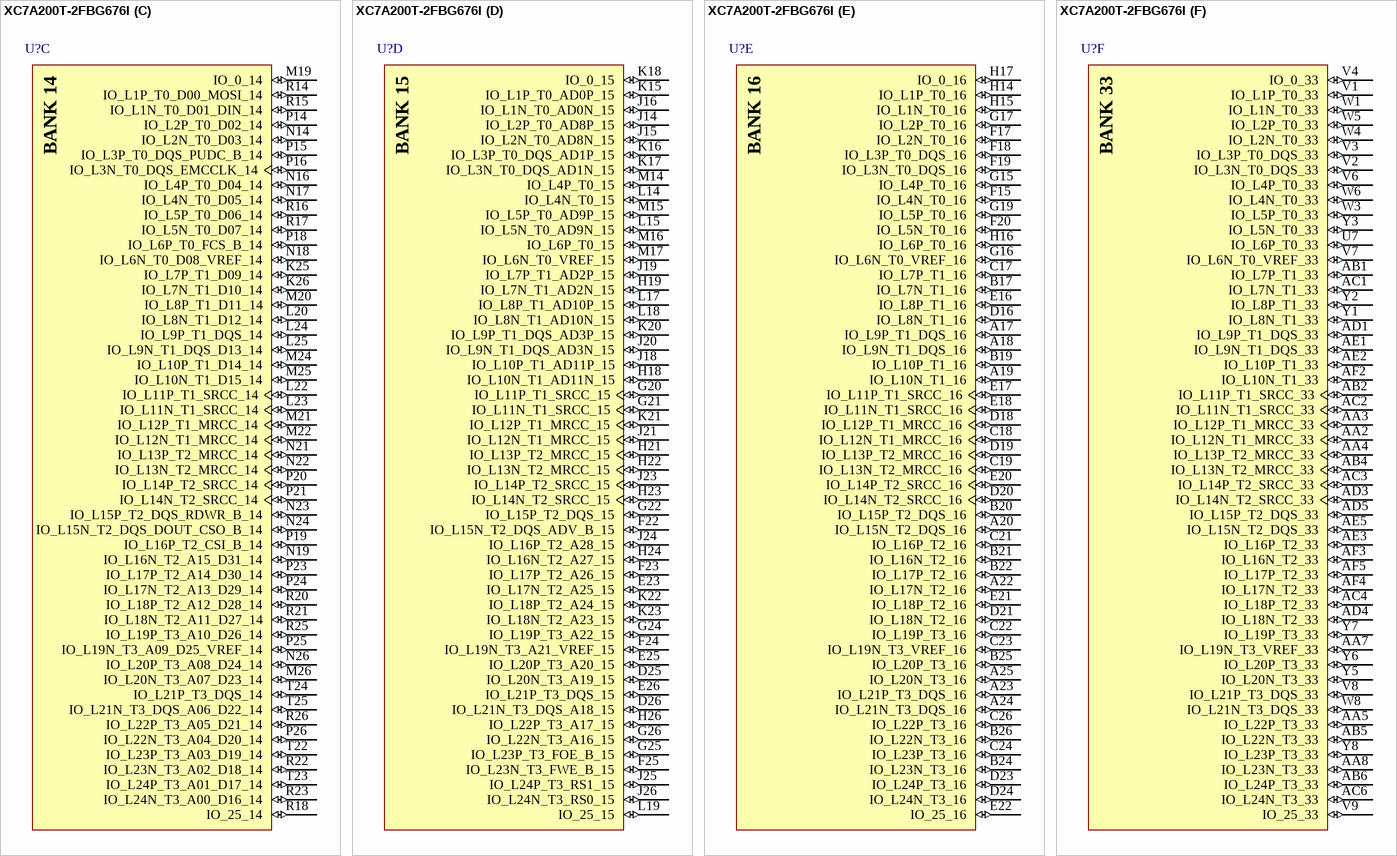
[diagram p47: symbol XC7A200T-2FBG676I]

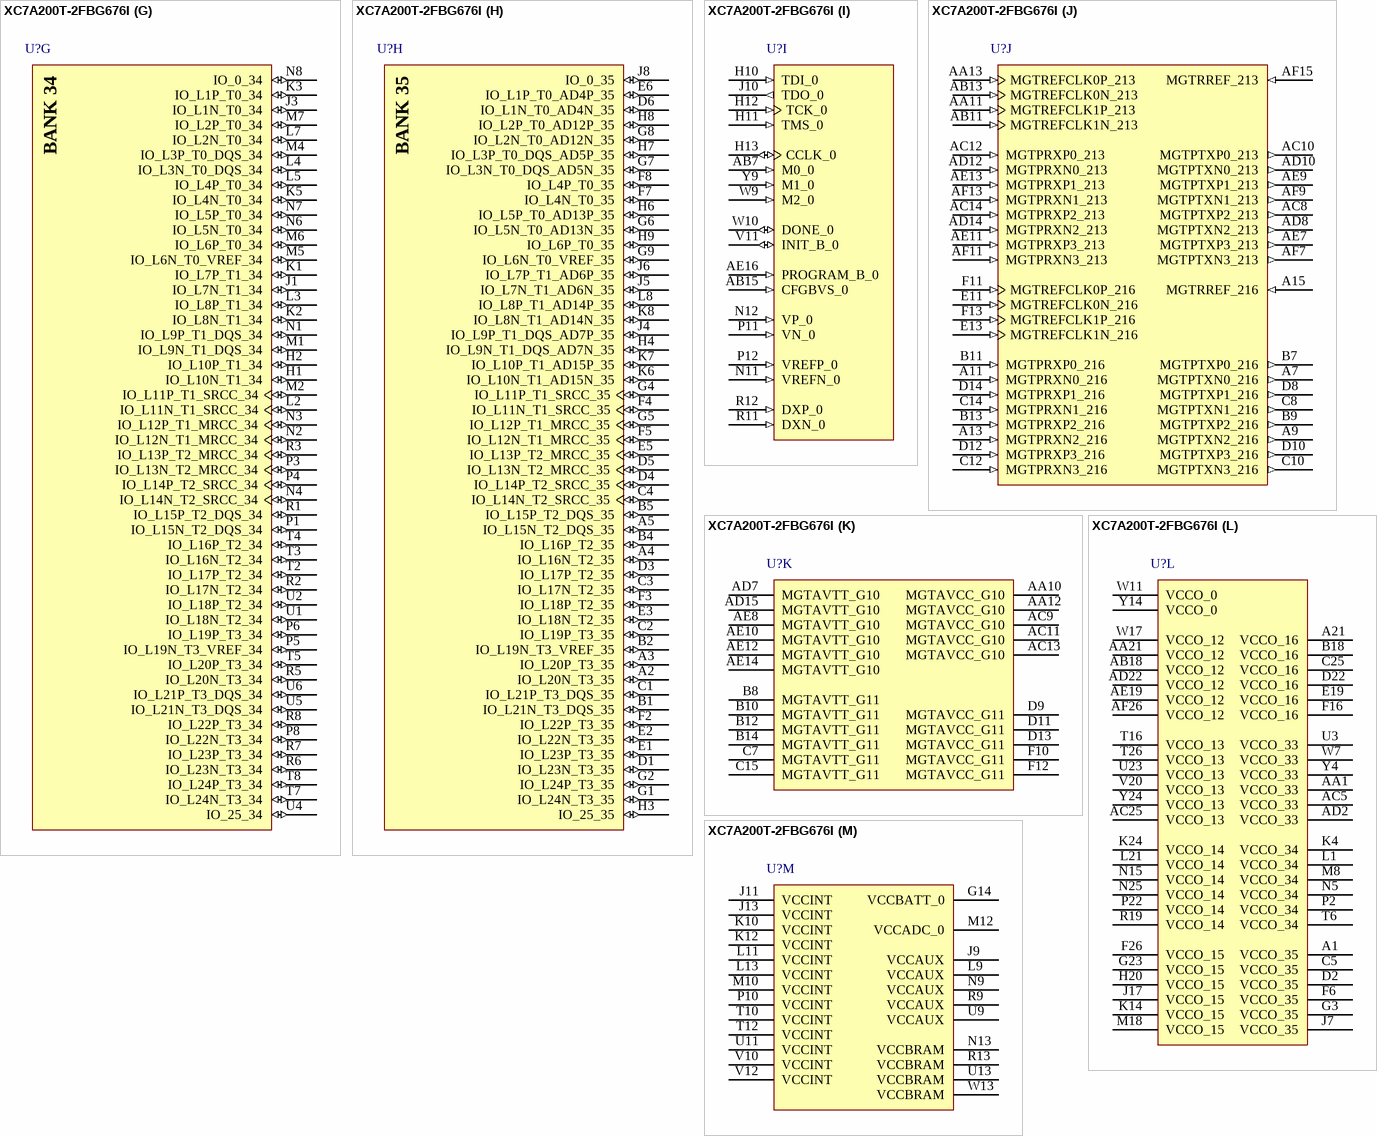
[diagram p48: symbol XC7A200T-2FBG676I]

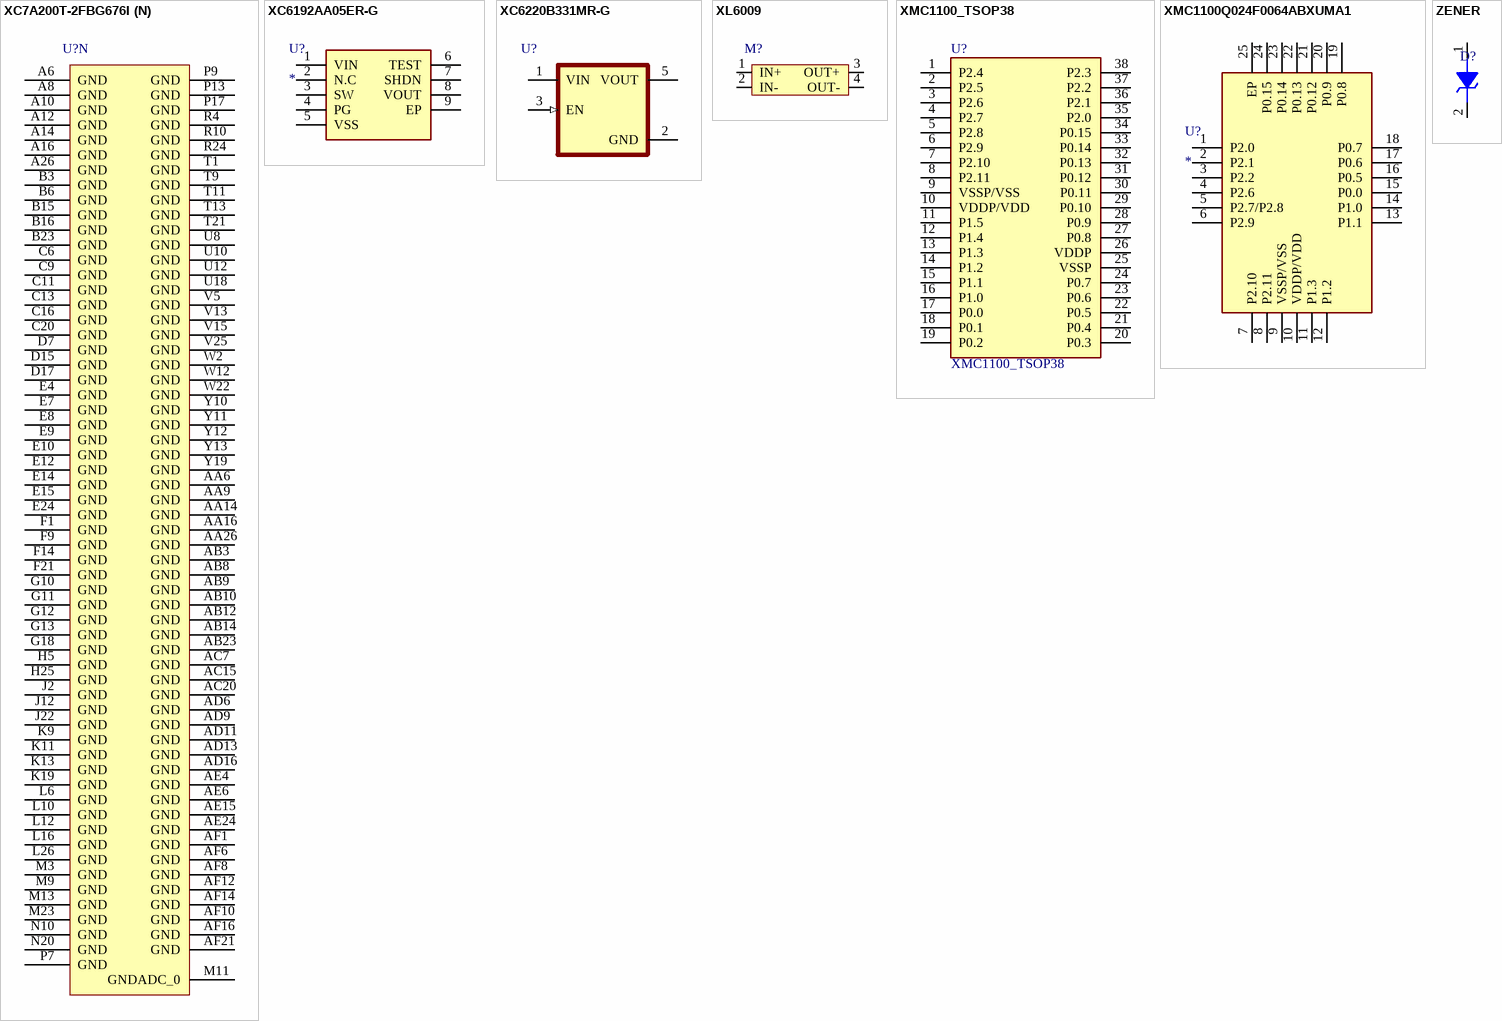
[diagram p49: symbols XC7A200T-2FBG676I to ZENER]